# Altium footprint library zynq.PcbLib: 111 footprints (part 2 of 7)
Each footprint in its own frame and in the unit in brackets; x right, y up, seen from the top. Pads: shape width x height; smd on the part's side, far side on the other; paste and mask are expansions set on the pad; w line width, h text height; cw(c..) or ccw(c..) is an arc to the next point about the centre after c.
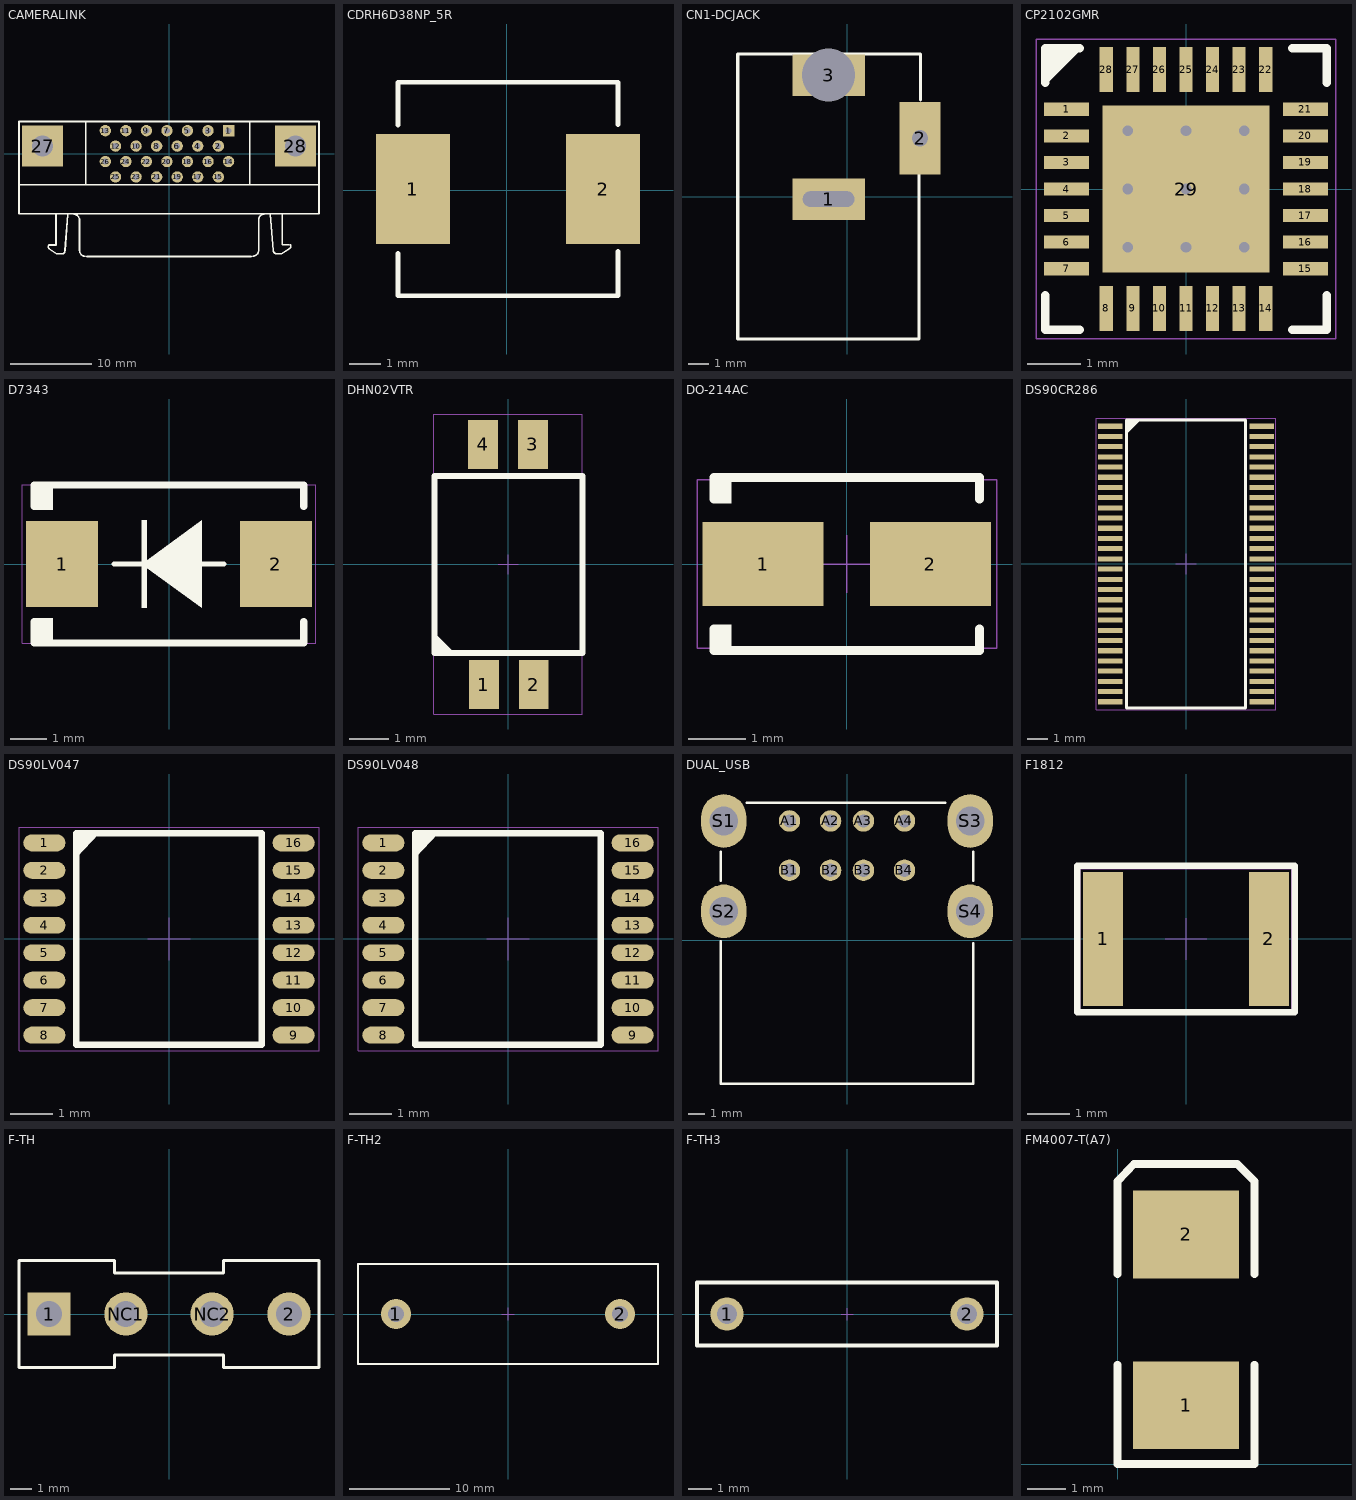
[diagram p1: the footprints below, top view; thin cyan lines are the x and y axes]

## CAMERALINK [mil]
pads (28):
  rect 55.12x55.12 hole 28: 1(290,112.5)
  round 55.12 hole 28: 2(240,37.5) 3(190,112.5) 4(140,37.5) 5(90,112.5) 6(40,37.5) 7(-10,112.5) 8(-60,37.5) 9(-110,112.5) 10(-160,37.5) 11(-210,112.5) 12(-260,37.5) 13(-310,112.5) 14(290,-37.5) 15(240,-112.5) 16(190,-37.5) 17(140,-112.5) 18(90,-37.5) 19(40,-112.5) 20(-10,-37.5) 21(-60,-112.5) 22(-110,-37.5) 23(-160,-112.5) 24(-210,-37.5) 25(-260,-112.5) 26(-310,-37.5)
  rect 200x200 hole 102: 27(-615.5,37.5) 28(615.5,37.5)
Top Overlay:
  lines w7.87: -730,-150 730,-150 ; -583.96,-462.55 -546.96,-487.26 -518.52,-487.26 ccw(c-522.55,-471.61) -506.39,-471.61 ; -583.41,-461.95 cw(c-574.52,-452.32) -584.36,-443.65 -549.71,-443.65 -549.71,-294.44 ; -506.41,-472.39 -491.84,-294.44 ; -462.7,-294.64 cw(c-462.7,-322) -435.34,-322 -435.34,-471.61 ; -435.08,-471.2 ccw(c-407.72,-471.2) -407.72,-498.56 ; -405.15,-150 -405.15,157.5 ; -400,-500 400,-500 ; 393.42,-150 393.42,157.5 ; 408.93,-497.69 ccw(c408.93,-470.32) 436.29,-470.32 ; 436.49,-470.13 436.49,-320.52 cw(c463.85,-320.52) 463.85,-293.16 ; 492.99,-292.96 507.55,-470.91 ; 507.53,-470.13 ccw(c523.7,-470.13) 519.67,-485.78 548.1,-485.78 585.11,-461.07 ; 550.86,-292.96 550.86,-442.17 585.51,-442.17 ; 588.89,-460.06 ccw(c580,-450.42) 589.84,-441.76 ; -730,-292.5 730,-292.5 730,157.5 -730,157.5 -730,-292.5

## CDRH6D38NP_5R [mil] "CDRH6D38NP_5R"
pads (2):
  rect 92.5x137.8 smd: 1(-117.59,1.5) 2(120.59,1.5)
Top Overlay:
  lines w6: -136.3,-79.5 -136.3,-132.36 139.3,-132.36 139.3,-76.5 ; -136.3,81.5 -136.3,135.36 139.3,135.36 139.3,82.5
Mechanical 10:
  text "1" at -107.59,1.5 h25
  text "2" at 130.59,1.5 h25

## CN1-DCJACK [mil] "CN1-DCJACK"
pads (3):
  rect 140x80 hole 100 slot 30 at 90 deg: 1(-35.59,-5)
  rect 80x140 hole 31.5: 2(141.58,113)
  rect 140x80 hole 102.36: 3(-35.59,235.16)
Top Overlay:
  lines w6: 139.41,43 139.41,-276 -211.59,-276 -211.59,276 142.41,276 142.41,187

## CP2102GMR [mm] "QFN, 28-Leads, Body 5.00x5.00mm, Pitch 0.50mm, Thermal Pad 3.20x3.20mm, IPC High Density"
height 1
pads (29):
  rect 0.85x0.25 smd: 1(-2.25,1.5) 2(-2.25,1) 3(-2.25,0.5) 4(-2.25,0) 5(-2.25,-0.5) 6(-2.25,-1) 7(-2.25,-1.5) 15(2.25,-1.5) 16(2.25,-1) 17(2.25,-0.5) 18(2.25,0) 19(2.25,0.5) 20(2.25,1) 21(2.25,1.5)
  rect 0.25x0.85 smd: 8(-1.5,-2.25) 9(-1,-2.25) 10(-0.5,-2.25) 11(0,-2.25) 12(0.5,-2.25) 13(1,-2.25) 14(1.5,-2.25) 22(1.5,2.25) 23(1,2.25) 24(0.5,2.25) 25(0,2.25) 26(-0.5,2.25) 27(-1,2.25) 28(-1.5,2.25)
  rect 3.15x3.15 smd: 29(0,0)
via -1.1,1.1 diameter 0.45 hole 0.2
via 0,1.1 diameter 0.45 hole 0.2
via 1.1,1.1 diameter 0.45 hole 0.2
via -1.1,0 diameter 0.45 hole 0.2
via 0,0 diameter 0.45 hole 0.2
via 1.1,0 diameter 0.45 hole 0.2
via -1.1,-1.1 diameter 0.45 hole 0.2
via 0,-1.1 diameter 0.45 hole 0.2
via 1.1,-1.1 diameter 0.45 hole 0.2
Top Overlay:
  region: -1.954,2.65 -2.65,1.954 -2.65,2.65
  lines w0.152: -2.65,-2.001 -2.65,-2.65 -2.001,-2.65 ; -2.65,2.001 -2.65,2.65 -2.001,2.65 ; 2.001,-2.65 2.65,-2.65 2.65,-2.001 ; 2.001,2.65 2.65,2.65 2.65,2.001
Mechanical 15:
  lines w0.025: -0.5,0 0.5,0 ; 0,-0.5 0,0.5 ; -2.825,-2.825 -2.825,2.825 2.825,2.825 2.825,-2.825 -2.825,-2.825
3D body "cp2102gmr.STEP": height 0.82, standoff 0, extent -2.51,-2.52 2.51,2.5

## D7343 [mm] "D7343"
pads (2):
  rect 2x2.4 smd: 1(-2.975,0) 2(2.975,0)
Top Overlay:
  rectangle: -0.762,-1.219 -0.61,1.219
  rectangle: -3.75,-2.2 -3.226,-1.499
  rectangle: -3.75,1.499 -3.226,2.2
  region: -0.762,0 0.914,1.219 0.914,-1.219
  lines w0.152: -1.524,0 -0.762,0 ; 0.914,0 1.524,0
  lines w0.2: -3.75,-1.6 -3.75,-2.2 3.75,-2.2 3.75,-1.6 ; -3.75,1.6 -3.75,2.2 3.75,2.2 3.75,1.6
Mechanical 15:
  lines w0.025: -0.5,0 0.5,0 ; 0,-0.5 0,0.5 ; -4.089,-2.2 4.089,-2.2 4.089,2.2 -4.089,2.2 -4.089,-2.2
3D body "7343-31-CASE-D-2917.STEP": height 2.92, standoff 0, extent -3.63,-2.166 3.681,2.134

## DHN02VTR [mm] "2 switch"
pads (4):
  rect 0.76x1.25 smd: 1(-0.626,-3.059) 2(0.644,-3.059) 3(0.626,3.059) 4(-0.644,3.059)
Top Overlay:
  region: -1.879,-1.753 -1.372,-2.261 -1.874,-2.261 -1.885,-2.25
  lines w0.152: -1.885,-2.25 1.885,-2.25 1.885,2.25 -1.885,2.25 -1.885,-2.25
Mechanical 15:
  lines w0.025: -0.254,0 0.254,0 ; 0,-0.254 0,0.254 ; -1.905,-3.81 1.88,-3.81 1.88,3.835 -1.905,3.835 -1.905,-3.81
3D body "dhn-02-v-tr.STEP": height 1.44, standoff -0.02, extent -1.885,-3.124 1.885,3.138

## DO-214AC [mm] "DO-214AC"
pads (2):
  rect 2.1x1.45 smd: 1(-1.45,0) 2(1.45,0)
Top Overlay:
  rectangle: -2.3,1.046 -2.002,1.5
  rectangle: -2.3,-1.5 -2.002,-1.046
  lines w0.152: -2.3,-1.125 -2.3,-1.5 2.3,-1.5 2.3,-1.125 ; -2.3,1.125 -2.3,1.5 2.3,1.5 2.3,1.125
Mechanical 15:
  lines w0.025: -0.5,0 0.5,0 ; 0,-0.5 0,0.5 ; -2.597,-1.46 -2.597,1.46 2.603,1.46 2.603,-1.46 -2.597,-1.46
3D body "do-214ac.STEP": height 2.06, standoff 0.01, extent -2.351,-1.324 2.351,1.346

## DS90CR286 [mm]
height 1.2
pads (56):
  rect 1.2x0.25 smd: 1(-3.7,6.75) 2(-3.7,6.25) 3(-3.7,5.75) 4(-3.7,5.25) 5(-3.7,4.75) 6(-3.7,4.25) 7(-3.7,3.75) 8(-3.7,3.25) 9(-3.7,2.75) 10(-3.7,2.25) 11(-3.7,1.75) 12(-3.7,1.25) 13(-3.7,0.75) 14(-3.7,0.25) 15(-3.7,-0.25) 16(-3.7,-0.75) 17(-3.7,-1.25) 18(-3.7,-1.75) 19(-3.7,-2.25) 20(-3.7,-2.75) 21(-3.7,-3.25) 22(-3.7,-3.75) 23(-3.7,-4.25) 24(-3.7,-4.75) 25(-3.7,-5.25) 26(-3.7,-5.75) 27(-3.7,-6.25) 28(-3.7,-6.75) 29(3.7,-6.75) 30(3.7,-6.25) 31(3.7,-5.75) 32(3.7,-5.25) 33(3.7,-4.75) 34(3.7,-4.25) 35(3.7,-3.75) 36(3.7,-3.25) 37(3.7,-2.75) 38(3.7,-2.25) 39(3.7,-1.75) 40(3.7,-1.25) 41(3.7,-0.75) 42(3.7,-0.25) 43(3.7,0.25) 44(3.7,0.75) 45(3.7,1.25) 46(3.7,1.75) 47(3.7,2.25) 48(3.7,2.75) 49(3.7,3.25) 50(3.7,3.75) 51(3.7,4.25) 52(3.7,4.75) 53(3.7,5.25) 54(3.7,5.75) 55(3.7,6.25) 56(3.7,6.75)
Top Overlay:
  region: -2.159,7.112 -2.921,6.35 -2.921,7.05
  lines w0.152: -2.921,-7.05 2.921,-7.05 2.921,7.05 -2.921,7.05 -2.921,-7.05
Mechanical 15:
  lines w0.025: -0.5,0 0.5,0 ; 0,-0.5 0,0.5 ; -4.4,-7.15 4.4,-7.15 4.4,7.15 -4.4,7.15 -4.4,-7.15
3D body "ds90cr286.STEP": height 1.1, standoff 0, extent -4.095,-7.044 4.066,6.956

## DS90LV047 [mm]
height 1.2
pads (16):
  oval 1x0.4 smd: 1(-2.95,2.275) 2(-2.95,1.625) 3(-2.95,0.975) 4(-2.95,0.325) 5(-2.95,-0.325) 6(-2.95,-0.975) 7(-2.95,-1.625) 8(-2.95,-2.275) 9(2.95,-2.275) 10(2.95,-1.625) 11(2.95,-0.975) 12(2.95,-0.325) 13(2.95,0.325) 14(2.95,0.975) 15(2.95,1.625) 16(2.95,2.275)
Top Overlay:
  region: -1.655,2.5 -2.2,2.5 -2.2,1.923
  lines w0.152: -2.2,-2.5 2.2,-2.5 2.2,2.5 -2.2,2.5 -2.2,-2.5
Mechanical 15:
  lines w0.025: -0.5,0 0.5,0 ; 0,-0.5 0,0.5 ; -3.55,-2.65 3.55,-2.65 3.55,2.65 -3.55,2.65 -3.55,-2.65
3D body "ds90lv047.STEP": height 1.2, standoff -0.02, extent -3.161,-2.515 3.263,2.487

## DS90LV048 [mm]
height 1.2
pads (16):
  oval 1x0.4 smd: 1(-2.95,2.275) 2(-2.95,1.625) 3(-2.95,0.975) 4(-2.95,0.325) 5(-2.95,-0.325) 6(-2.95,-0.975) 7(-2.95,-1.625) 8(-2.95,-2.275) 9(2.95,-2.275) 10(2.95,-1.625) 11(2.95,-0.975) 12(2.95,-0.325) 13(2.95,0.325) 14(2.95,0.975) 15(2.95,1.625) 16(2.95,2.275)
Top Overlay:
  region: -1.655,2.5 -2.2,2.5 -2.2,1.923
  lines w0.152: -2.2,-2.5 -2.2,2.5 2.2,2.5 2.2,-2.5 -2.2,-2.5
Mechanical 15:
  lines w0.025: -0.5,0 0.5,0 ; 0,-0.5 0,0.5 ; -3.55,-2.65 -3.55,2.65 3.55,2.65 3.55,-2.65 -3.55,-2.65
3D body "ds90lv047.STEP": height 1.2, standoff -0.02, extent -3.161,-2.515 3.263,2.487

## DUAL_USB [mil] "DUAL_USB"
pads (12):
  round 51.5 hole 31.5: A1(-137.8,285.36) A2(-39.37,285.36) A3(39.37,285.36) A4(137.8,285.36) B1(-137.8,167.25) B2(-39.37,167.25) B3(39.37,167.25) B4(137.8,167.25)
  oval 108.42x128.42 hole 68.42: S1(-295.28,285.36) S2(-295.28,68.82) S3(295.28,285.36) S4(295.28,68.82)
Top Overlay:
  lines w6: -303.15,-2.91 -303.15,-344.56 303.15,-344.56 303.15,-7.91 ; -303.15,142.09 -303.15,212.09 ; -240,328.67 235,328.67 ; 303.15,142.09 303.15,212.09

## F1812 [mm] "FUSE_1812"
pads (2):
  rect 0.95x3.2 smd: 1(-1.975,0) 2(1.975,0)
Top Overlay:
  lines w0.152: -2.591,-1.75 -2.591,1.75 2.591,1.75 2.591,-1.75 -2.591,-1.75
Mechanical 15:
  lines w0.025: -0.5,0 0.5,0 ; 0,-0.5 0,0.5 ; -2.515,-1.676 -2.515,1.676 2.515,1.676 2.515,-1.676 -2.515,-1.676
3D body "F1812.STEP": height 1, standoff 0, extent -2.273,-1.612 2.277,1.628

## F-TH [mil]
pads (4):
  rect 79x79 hole 47: 1(-220,0)
  round 79 hole 47: 2(220,0) NC1(-79,0) NC2(79,0)
Top Overlay:
  lines w6: -275,-98 -100,-98 -100,-75 100,-75 100,-98 275,-98 275,98 100,98 100,75 -100,75 -100,98 -275,98 -275,-98

## F-TH2 [mm]
pads (2):
  round 3 hole 1.6: 1(-11.2,0) 2(11.2,0)
Top Overlay:
  lines w0.152: -15,-5 -15,5 15,5 15,-5 -15,-5
Mechanical 15:
  lines w0.025: -0.635,0 0.635,0 ; 0,-0.635 0,0.635
  lines w0.152: -15,-5 -15,5 15,5 15,-5 -15,-5

## F-TH3 [mm]
pads (2):
  round 1.4 hole 0.85: 1(-5.08,0) 2(5.08,0)
Top Overlay:
  lines w0.152: -6.35,-1.333 -6.35,1.333 6.35,1.333 6.35,-1.333 -6.35,-1.333
Mechanical 15:
  lines w0.025: -0.254,0 0.254,0 ; 0,-0.254 0,0.254 ; -6.35,-1.333 -6.35,1.333 6.35,1.333 6.35,-1.333 -6.35,-1.333

## FM4007-T(A7) [mil] "整流二极管"
pads (2):
  rect 110x91 smd: 1(71,61) 2(71,238)
Top Overlay:
  lines w8: 0,103 0,0 142,0 142,103 ; 0,197 0,293 17,311 ; 18,311 124,311 141,294 ; 142,197 142,293